# Altium footprint library RcMPPTLib.PcbLib: 82 footprints (part 6 of 6)
Each footprint in its own frame and in the unit in brackets; x right, y up, seen from the top. Pads: shape width x height; smd on the part's side, far side on the other; paste and mask are expansions set on the pad; w line width, h text height; cw(c..) or ccw(c..) is an arc to the next point about the centre after c.
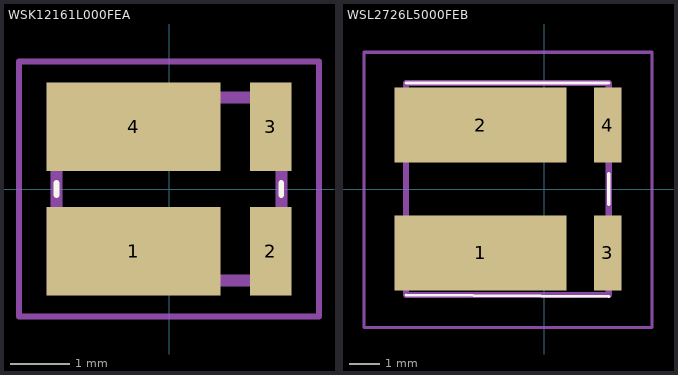
[diagram p5: the footprints below, top view; thin cyan lines are the x and y axes]

## WSK12161L000FEA [mm]
pads (4):
  rect 2.95x1.495 smd: 1(-0.6,-1.053) 4(-0.6,1.053)
  rect 0.7x1.495 smd: 2(1.725,-1.053) 3(1.725,1.053)
Top Overlay:
  lines w0.1: -1.905,-0.1 -1.905,0.1 ; 1.9,-0.1 1.9,0.1
Mechanical 13:
  lines w0.2: -1.905,-1.55 -1.905,1.55 1.905,1.55 1.905,-1.55 -1.905,-1.55
Mechanical 15:
  lines w0.1: -2.54,-2.159 -2.54,2.159 2.54,2.159 2.54,-2.159 -2.54,-2.159
3D body "CurrentShunt v2.step": height 1.51, standoff 0.02, extent -2.032,-1.747 1.977,1.747

## WSL2726L5000FEB [mm]
pads (4):
  rect 5.6x2.44 smd: 1(-2.067,-2.08) 2(-2.067,2.08)
  rect 0.89x2.44 smd: 3(2.067,-2.08) 4(2.067,2.08)
Top Overlay:
  lines w0.1: -4.5,-3.45 2.1,-3.5 ; -4.5,3.45 2.1,3.45 ; 2.1,-0.5 2.1,0.5
Mechanical 13:
  lines w0.2: -4.5,-3.45 2.1,-3.45 2.1,3.45 -4.5,3.45 -4.5,-3.45
Mechanical 15:
  lines w0.1: -5.867,-4.5 3.513,-4.5 3.513,4.45 -5.867,4.45 -5.867,-4.5
3D body "WSL2726L5000FEB.stp": height 3.01, standoff 0.06, extent -4.064,-3.45 2.536,3.45